# Altium footprint library Pcb-hionyPcbLib.PcbLib: 580 footprints (part 26 of 37)
Each footprint in its own frame and in the unit in brackets; x right, y up, seen from the top. Pads: shape width x height; smd on the part's side, far side on the other; paste and mask are expansions set on the pad; w line width, h text height; cw(c..) or ccw(c..) is an arc to the next point about the centre after c.
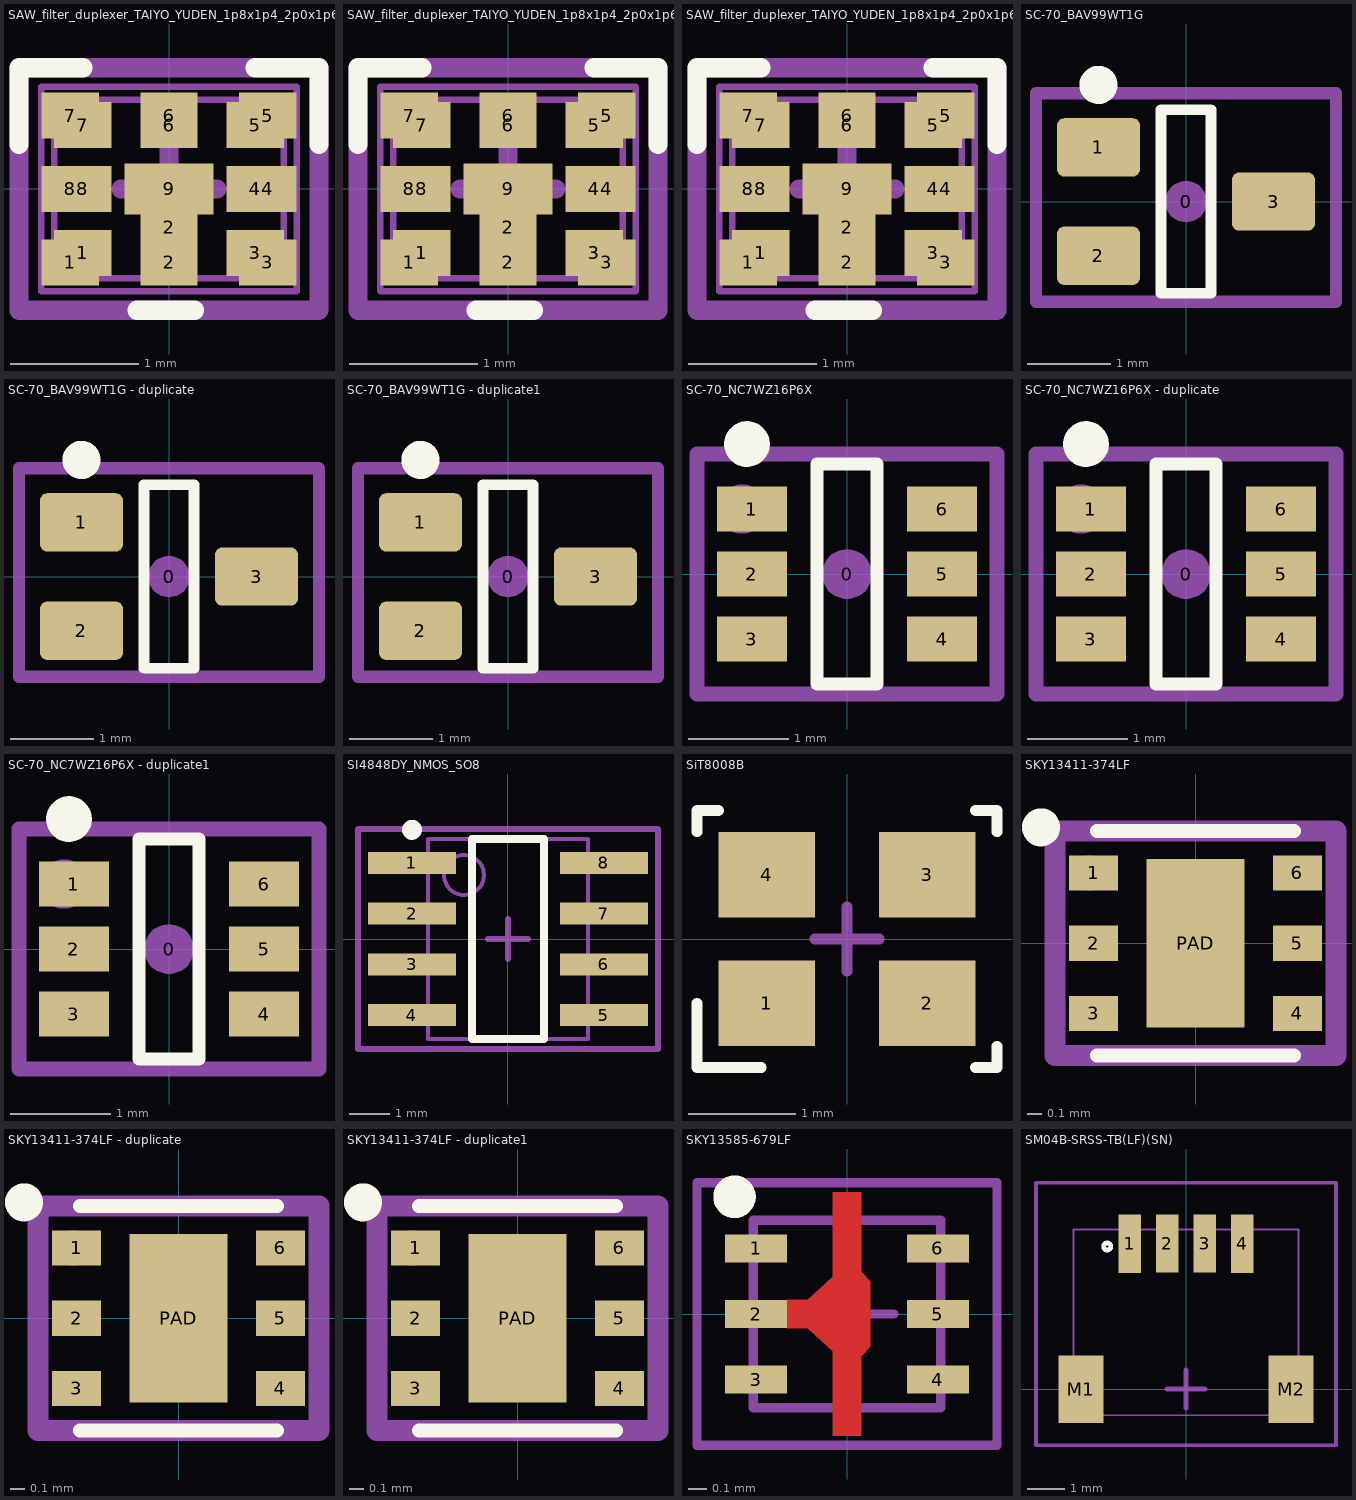
[diagram p25: the footprints below, top view; thin cyan lines are the x and y axes]

## SAW_filter_duplexer_TAIYO_YUDEN_1p8x1p4_2p0x1p6 [mm]
pads (17):
  rect 0.45x0.36 smd mask+0.05: 1(-0.775,-0.575) 1(-0.675,-0.5) 2(0,-0.575) 3(0.675,-0.5) 3(0.775,-0.575) 4(0.675,0) 4(0.775,0) 5(0.675,0.5) 5(0.775,0.575) 6(0,0.5) 6(0,0.575) 7(-0.775,0.575) 7(-0.675,0.5) 8(-0.775,0) 8(-0.675,0)
  rect 0.45x0.75 smd mask+0.05: 2(0,-0.3)
  rect 0.7x0.4 smd mask+0.05: 9(0,0)
Top Overlay:
  lines w0.15: -1.175,0.35 -1.175,0.95 -0.675,0.95 ; -0.25,-0.95 0.2,-0.95 ; 0.675,0.95 1.175,0.95 1.175,0.35
Top Solder:
  region: -1.05,-0.825 -1.05,0.825 1.05,0.825 1.05,-0.825
Mechanical 13:
  region: -0.15,-0.575 -0.15,-0.005 0.15,-0.005 0.15,-0.575
  region: 0.775,-0.575 0.775,-0.345 0.475,-0.345 0.475,-0.575
  region: 0.775,0.345 0.775,0.575 0.475,0.575 0.475,0.345
  region: 0.775,-0.115 0.775,0.115 0.475,0.115 0.475,-0.115
  region: -0.15,0.345 -0.15,0.575 0.15,0.575 0.15,0.345
  region: -0.775,-0.115 -0.775,0.115 -0.475,0.115 -0.475,-0.115
  region: -0.775,0.345 -0.775,0.575 -0.475,0.575 -0.475,0.345
  region: -0.775,-0.575 -0.775,-0.345 -0.475,-0.345 -0.475,-0.575
  region: 0.625,-0.15 0.625,0.15 0.925,0.15 0.925,-0.15
  region: -0.3,-0.15 -0.3,0.15 0.3,0.15 0.3,-0.15
  region: -0.925,0.725 -0.925,0.425 -0.625,0.425 -0.625,0.725
  region: -0.15,0.725 -0.15,0.425 0.15,0.425 0.15,0.725
  region: 0.625,0.725 0.625,0.425 0.925,0.425 0.925,0.725
  region: 0.625,-0.725 0.625,-0.425 0.925,-0.425 0.925,-0.725
  region: -0.925,-0.15 -0.925,0.15 -0.625,0.15 -0.625,-0.15
  region: -0.15,-0.725 -0.15,-0.425 0.15,-0.425 0.15,-0.725
  region: -0.925,-0.725 -0.925,-0.425 -0.625,-0.425 -0.625,-0.725
  lines w0.05: -1,-0.8 -1,0.8 1,0.8 1,-0.8 -1,-0.8 ; -0.9,-0.7 0.9,-0.7 0.9,0.7 -0.9,0.7 -0.9,-0.7
  text "7" at -0.425,0.37 h0.2
  text "5" at 0.3,0.375 h0.2
  text "3" at 0.3,-0.55 h0.2
  text "1" at -0.425,-0.55 h0.2
  text "1" at -0.55,-0.675 h0.2
  text "3" at 0.4,-0.675 h0.2
  text "5" at 0.4,0.475 h0.2
  text "7" at -0.55,0.475 h0.2
Mechanical 15:
  circle w0.2: c-0.8,-0.575 r0.035
  lines w0.15: -0.375,0 0,0 ; 0,-0.375 0,0 ; 0,0.375 0,0 ; 0.375,0 0,0 ; -1.175,-0.95 -1.175,0.95 1.175,0.95 1.175,-0.95 -1.175,-0.95
  text ".Designator" at 1.005,-0.703 h0.55
3D body: height 0.5, standoff 0, extent -0.9,-0.7 0.9,0.7
3D body: height 0.5, standoff 0, extent -1,-0.8 1,0.8
3D body: height 0.55, standoff 0.5, extent -0.898,-0.699 -0.5,-0.3

## SAW_filter_duplexer_TAIYO_YUDEN_1p8x1p4_2p0x1p6 - duplicate [mm]
pads (17):
  rect 0.45x0.36 smd mask+0.05: 1(-0.775,-0.575) 1(-0.675,-0.5) 2(0,-0.575) 3(0.675,-0.5) 3(0.775,-0.575) 4(0.675,0) 4(0.775,0) 5(0.675,0.5) 5(0.775,0.575) 6(0,0.5) 6(0,0.575) 7(-0.775,0.575) 7(-0.675,0.5) 8(-0.775,0) 8(-0.675,0)
  rect 0.45x0.75 smd mask+0.05: 2(0,-0.3)
  rect 0.7x0.4 smd mask+0.05: 9(0,0)
Top Overlay:
  lines w0.15: -1.175,0.35 -1.175,0.95 -0.675,0.95 ; -0.25,-0.95 0.2,-0.95 ; 0.675,0.95 1.175,0.95 1.175,0.35
Top Solder:
  region: -1.05,-0.825 -1.05,0.825 1.05,0.825 1.05,-0.825
Mechanical 13:
  region: -0.15,-0.575 -0.15,-0.005 0.15,-0.005 0.15,-0.575
  region: 0.775,-0.575 0.775,-0.345 0.475,-0.345 0.475,-0.575
  region: 0.775,0.345 0.775,0.575 0.475,0.575 0.475,0.345
  region: 0.775,-0.115 0.775,0.115 0.475,0.115 0.475,-0.115
  region: -0.15,0.345 -0.15,0.575 0.15,0.575 0.15,0.345
  region: -0.775,-0.115 -0.775,0.115 -0.475,0.115 -0.475,-0.115
  region: -0.775,0.345 -0.775,0.575 -0.475,0.575 -0.475,0.345
  region: -0.775,-0.575 -0.775,-0.345 -0.475,-0.345 -0.475,-0.575
  region: 0.625,-0.15 0.625,0.15 0.925,0.15 0.925,-0.15
  region: -0.3,-0.15 -0.3,0.15 0.3,0.15 0.3,-0.15
  region: -0.925,0.725 -0.925,0.425 -0.625,0.425 -0.625,0.725
  region: -0.15,0.725 -0.15,0.425 0.15,0.425 0.15,0.725
  region: 0.625,0.725 0.625,0.425 0.925,0.425 0.925,0.725
  region: 0.625,-0.725 0.625,-0.425 0.925,-0.425 0.925,-0.725
  region: -0.925,-0.15 -0.925,0.15 -0.625,0.15 -0.625,-0.15
  region: -0.15,-0.725 -0.15,-0.425 0.15,-0.425 0.15,-0.725
  region: -0.925,-0.725 -0.925,-0.425 -0.625,-0.425 -0.625,-0.725
  lines w0.05: -1,-0.8 -1,0.8 1,0.8 1,-0.8 -1,-0.8 ; -0.9,-0.7 0.9,-0.7 0.9,0.7 -0.9,0.7 -0.9,-0.7
  text "7" at -0.425,0.37 h0.2
  text "5" at 0.3,0.375 h0.2
  text "3" at 0.3,-0.55 h0.2
  text "1" at -0.425,-0.55 h0.2
  text "1" at -0.55,-0.675 h0.2
  text "3" at 0.4,-0.675 h0.2
  text "5" at 0.4,0.475 h0.2
  text "7" at -0.55,0.475 h0.2
Mechanical 15:
  circle w0.2: c-0.8,-0.575 r0.035
  lines w0.15: -0.375,0 0,0 ; 0,-0.375 0,0 ; 0,0.375 0,0 ; 0.375,0 0,0 ; -1.175,-0.95 -1.175,0.95 1.175,0.95 1.175,-0.95 -1.175,-0.95
  text ".Designator" at -1.55,-0.675 h0.55
3D body: height 0.5, standoff 0, extent -0.9,-0.7 0.9,0.7
3D body: height 0.5, standoff 0, extent -1,-0.8 1,0.8
3D body: height 0.55, standoff 0.5, extent -0.898,-0.699 -0.5,-0.3

## SAW_filter_duplexer_TAIYO_YUDEN_1p8x1p4_2p0x1p6 - duplicate1 [mm]
pads (17):
  rect 0.45x0.36 smd mask+0.05: 1(-0.775,-0.575) 1(-0.675,-0.5) 2(0,-0.575) 3(0.675,-0.5) 3(0.775,-0.575) 4(0.675,0) 4(0.775,0) 5(0.675,0.5) 5(0.775,0.575) 6(0,0.5) 6(0,0.575) 7(-0.775,0.575) 7(-0.675,0.5) 8(-0.775,0) 8(-0.675,0)
  rect 0.45x0.75 smd mask+0.05: 2(0,-0.3)
  rect 0.7x0.4 smd mask+0.05: 9(0,0)
Top Overlay:
  lines w0.15: -1.175,0.35 -1.175,0.95 -0.675,0.95 ; -0.25,-0.95 0.2,-0.95 ; 0.675,0.95 1.175,0.95 1.175,0.35
Top Solder:
  region: -1.05,-0.825 -1.05,0.825 1.05,0.825 1.05,-0.825
Mechanical 13:
  region: -0.15,-0.575 -0.15,-0.005 0.15,-0.005 0.15,-0.575
  region: 0.775,-0.575 0.775,-0.345 0.475,-0.345 0.475,-0.575
  region: 0.775,0.345 0.775,0.575 0.475,0.575 0.475,0.345
  region: 0.775,-0.115 0.775,0.115 0.475,0.115 0.475,-0.115
  region: -0.15,0.345 -0.15,0.575 0.15,0.575 0.15,0.345
  region: -0.775,-0.115 -0.775,0.115 -0.475,0.115 -0.475,-0.115
  region: -0.775,0.345 -0.775,0.575 -0.475,0.575 -0.475,0.345
  region: -0.775,-0.575 -0.775,-0.345 -0.475,-0.345 -0.475,-0.575
  region: 0.625,-0.15 0.625,0.15 0.925,0.15 0.925,-0.15
  region: -0.3,-0.15 -0.3,0.15 0.3,0.15 0.3,-0.15
  region: -0.925,0.725 -0.925,0.425 -0.625,0.425 -0.625,0.725
  region: -0.15,0.725 -0.15,0.425 0.15,0.425 0.15,0.725
  region: 0.625,0.725 0.625,0.425 0.925,0.425 0.925,0.725
  region: 0.625,-0.725 0.625,-0.425 0.925,-0.425 0.925,-0.725
  region: -0.925,-0.15 -0.925,0.15 -0.625,0.15 -0.625,-0.15
  region: -0.15,-0.725 -0.15,-0.425 0.15,-0.425 0.15,-0.725
  region: -0.925,-0.725 -0.925,-0.425 -0.625,-0.425 -0.625,-0.725
  lines w0.05: -1,-0.8 -1,0.8 1,0.8 1,-0.8 -1,-0.8 ; -0.9,-0.7 0.9,-0.7 0.9,0.7 -0.9,0.7 -0.9,-0.7
  text "7" at -0.425,0.37 h0.2
  text "5" at 0.3,0.375 h0.2
  text "3" at 0.3,-0.55 h0.2
  text "1" at -0.425,-0.55 h0.2
  text "1" at -0.55,-0.675 h0.2
  text "3" at 0.4,-0.675 h0.2
  text "5" at 0.4,0.475 h0.2
  text "7" at -0.55,0.475 h0.2
Mechanical 15:
  circle w0.2: c-0.8,-0.575 r0.035
  lines w0.15: -0.375,0 0,0 ; 0,-0.375 0,0 ; 0,0.375 0,0 ; 0.375,0 0,0 ; -1.175,-0.95 -1.175,0.95 1.175,0.95 1.175,-0.95 -1.175,-0.95
  text ".Designator" at -1.55,-0.675 h0.55
3D body: height 0.5, standoff 0, extent -0.9,-0.7 0.9,0.7
3D body: height 0.5, standoff 0, extent -1,-0.8 1,0.8
3D body: height 0.55, standoff 0.5, extent -0.898,-0.699 -0.5,-0.3

## SC-70_BAV99WT1G [mm]
pads (4):
  round 0.5 on Mech15: 0(0,0)
  rrect25% 1x0.7 smd: 1(-1.05,0.65) 2(-1.05,-0.65) 3(1.05,0)
Top Overlay:
  circle w0.254: c-1.05,1.4 r0.102
  lines w0.127: -0.3,-1.1 0.3,-1.1 0.3,1.1 -0.3,1.1 -0.3,-1.1
Mechanical 15:
  circle w0.35: c-1.05,0.65 r0.127
  lines w0.15: -1.8,-1.2 1.8,-1.2 1.8,1.3 -1.8,1.3 -1.8,-1.2
  text ".Designator" at 0.5,0.9 h0.55
3D body "User Library-sc70-3.step": height 0.99, standoff -0.01, extent -1.15,-1.05 1.15,1.05

## SC-70_BAV99WT1G - duplicate [mm]
pads (4):
  round 0.5 on Mech15: 0(0,0)
  rrect25% 1x0.7 smd: 1(-1.05,0.65) 2(-1.05,-0.65) 3(1.05,0)
Top Overlay:
  circle w0.254: c-1.05,1.4 r0.102
  lines w0.127: -0.3,-1.1 0.3,-1.1 0.3,1.1 -0.3,1.1 -0.3,-1.1
Mechanical 15:
  circle w0.35: c-1.05,0.65 r0.127
  lines w0.15: -1.8,-1.2 1.8,-1.2 1.8,1.3 -1.8,1.3 -1.8,-1.2
  text ".Designator" at 0.5,0.9 h0.55
3D body "User Library-sc70-3.step": height 0.99, standoff -0.01, extent -1.15,-1.05 1.15,1.05

## SC-70_BAV99WT1G - duplicate1 [mm]
pads (4):
  round 0.5 on Mech15: 0(0,0)
  rrect25% 1x0.7 smd: 1(-1.05,0.65) 2(-1.05,-0.65) 3(1.05,0)
Top Overlay:
  circle w0.254: c-1.05,1.4 r0.102
  lines w0.127: -0.3,-1.1 -0.3,1.1 0.3,1.1 0.3,-1.1 -0.3,-1.1
Mechanical 15:
  circle w0.35: c-1.05,0.65 r0.127
  lines w0.15: -1.8,-1.2 -1.8,1.3 1.8,1.3 1.8,-1.2 -1.8,-1.2
  text ".Designator" at 0.5,0.9 h0.55
3D body "User Library-sc70-3.step": height 0.99, standoff -0.01, extent -1.15,-1.05 1.15,1.05

## SC-70_NC7WZ16P6X [mm]
pads (7):
  round 0.5 on Mech15: 0(0,0)
  rect 0.7x0.45 smd: 1(-0.95,0.65) 2(-0.95,0) 3(-0.95,-0.65) 4(0.95,-0.65) 5(0.95,0) 6(0.95,0.65)
Top Overlay:
  circle w0.254: c-1,1.3 r0.102
  lines w0.127: -0.3,-1.1 -0.3,1.1 0.3,1.1 0.3,-1.1 -0.3,-1.1
Mechanical 15:
  circle w0.35: c-1.05,0.65 r0.071
  lines w0.15: -1.5,-1.2 -1.5,1.2 1.5,1.2 1.5,-1.2 -1.5,-1.2
  text ".Designator" at 0.922,-1.525 h0.55
3D body "User Library-SC70-6.step": height 0.92, standoff -0.03, extent -1.05,-1 1.05,1

## SC-70_NC7WZ16P6X - duplicate [mm]
pads (7):
  round 0.5 on Mech15: 0(0,0)
  rect 0.7x0.45 smd: 1(-0.95,0.65) 2(-0.95,0) 3(-0.95,-0.65) 4(0.95,-0.65) 5(0.95,0) 6(0.95,0.65)
Top Overlay:
  circle w0.254: c-1,1.3 r0.102
  lines w0.127: -0.3,-1.1 -0.3,1.1 0.3,1.1 0.3,-1.1 -0.3,-1.1
Mechanical 15:
  circle w0.35: c-1.05,0.65 r0.071
  lines w0.15: -1.5,-1.2 -1.5,1.2 1.5,1.2 1.5,-1.2 -1.5,-1.2
  text ".Designator" at 0.922,-1.525 h0.55
3D body "User Library-SC70-6.step": height 0.92, standoff -0.03, extent -1.05,-1 1.05,1

## SC-70_NC7WZ16P6X - duplicate1 [mm]
pads (7):
  round 0.5 on Mech15: 0(0,0)
  rect 0.7x0.45 smd: 1(-0.95,0.65) 2(-0.95,0) 3(-0.95,-0.65) 4(0.95,-0.65) 5(0.95,0) 6(0.95,0.65)
Top Overlay:
  circle w0.254: c-1,1.3 r0.102
  lines w0.127: -0.3,-1.1 -0.3,1.1 0.3,1.1 0.3,-1.1 -0.3,-1.1
Mechanical 15:
  circle w0.35: c-1.05,0.65 r0.071
  lines w0.15: -1.5,-1.2 -1.5,1.2 1.5,1.2 1.5,-1.2 -1.5,-1.2
  text ".Designator" at 0.922,-1.525 h0.55
3D body "User Library-SC70-6.step": height 0.92, standoff -0.03, extent -1.05,-1 1.05,1

## SI4848DY_NMOS_SO8 [mm]
pads (8):
  rect 2.2x0.55 smd: 1(-2.4,1.905) 2(-2.4,0.635) 3(-2.4,-0.635) 4(-2.4,-1.905) 5(2.4,-1.905) 6(2.4,-0.635) 7(2.4,0.635) 8(2.4,1.905)
Top Overlay:
  circle w0.25: c-2.4,2.73 r0.125
  lines w0.2: -0.9,-2.5 0.9,-2.5 0.9,2.5 -0.9,2.5 -0.9,-2.5
Mechanical 13:
  circle w0.1: c-1.1,1.6 r0.5
  lines w0.1: -2,-2.5 2,-2.5 2,2.5 -2,2.5 -2,-2.5
Mechanical 15:
  lines w0.15: -0.5,0 0.5,0 ; 0,-0.5 0,0.5 ; -3.75,-2.75 3.75,-2.75 3.75,2.75 -3.75,2.75 -3.75,-2.75
  text ".Designator" at 0.85,0.75 h0.55
3D body "CircuitWorks-SO-8.step": height 1.45, standoff 0, extent -2.889,-2.45 2.889,2.452

## SiT8008B [mm]
pads (4):
  rect 0.9x0.8 smd: 1(-0.75,-0.6) 2(0.75,-0.6) 3(0.75,0.6) 4(-0.75,0.6)
Top Overlay:
  lines w0.1: -1.4,-0.6 -1.4,-1.2 -0.8,-1.2 ; -1.4,1 -1.4,1.2 -1.2,1.2 ; 1.2,-1.2 1.4,-1.2 1.4,-1 ; 1.2,1.2 1.4,1.2 1.4,1
Mechanical 15:
  lines w0.1: -0.3,0 0.3,0 ; 0,-0.3 0,0.3
3D body "Crystal IQXC-42.stp": height 0.51, standoff 0.01, extent -1,-0.8 1,0.8

## SKY13411-374LF [mm]
pads (7):
  rect 0.35x0.25 smd mask+0.05: 1(-0.725,0.5) 2(-0.725,0) 3(-0.725,-0.5) 4(0.725,-0.5) 5(0.725,0) 6(0.725,0.5)
  rect 0.7x1.2 smd mask+0.05: PAD(0,0)
Top Overlay:
  circle w0.2: c-1.1,0.825 r0.035
  lines w0.1: -0.7,-0.8 0.7,-0.8 ; -0.7,0.8 0.7,0.8
Mechanical 15:
  circle w0.2: c-0.75,0.5 r0.025
  lines w0.15: -0.2,0 0.2,0 ; 0,-0.2 0,0.2 ; -1,-0.8 1,-0.8 1,0.8 -1,0.8 -1,-0.8
  text ".Designator" at 0.223,0.675 h0.55
3D body "User Library-DFN 6 2x2_v2.STEP": height 0.48, standoff -0.03, extent -0.752,-0.75 0.751,0.75

## SKY13411-374LF - duplicate [mm]
pads (7):
  rect 0.35x0.25 smd mask+0.05: 1(-0.725,0.5) 2(-0.725,0) 3(-0.725,-0.5) 4(0.725,-0.5) 5(0.725,0) 6(0.725,0.5)
  rect 0.7x1.2 smd mask+0.05: PAD(0,0)
Top Overlay:
  circle w0.2: c-1.1,0.825 r0.035
  lines w0.1: -0.7,-0.8 0.7,-0.8 ; -0.7,0.8 0.7,0.8
Mechanical 15:
  circle w0.2: c-0.75,0.5 r0.025
  lines w0.15: -0.2,0 0.2,0 ; 0,-0.2 0,0.2 ; -1,-0.8 1,-0.8 1,0.8 -1,0.8 -1,-0.8
  text ".Designator" at -2.925,-0.225 h0.55
3D body "User Library-DFN 6 2x2_v2.STEP": height 0.48, standoff -0.03, extent -0.752,-0.75 0.751,0.75

## SKY13411-374LF - duplicate1 [mm]
pads (7):
  rect 0.35x0.25 smd mask+0.05: 1(-0.725,0.5) 2(-0.725,0) 3(-0.725,-0.5) 4(0.725,-0.5) 5(0.725,0) 6(0.725,0.5)
  rect 0.7x1.2 smd mask+0.05: PAD(0,0)
Top Overlay:
  circle w0.2: c-1.1,0.825 r0.035
  lines w0.1: -0.7,-0.8 0.7,-0.8 ; -0.7,0.8 0.7,0.8
Mechanical 15:
  circle w0.2: c-0.75,0.5 r0.025
  lines w0.15: -0.2,0 0.2,0 ; 0,-0.2 0,0.2 ; -1,-0.8 1,-0.8 1,0.8 -1,0.8 -1,-0.8
  text ".Designator" at -2.925,-0.225 h0.55
3D body "User Library-DFN 6 2x2_v2.STEP": height 0.48, standoff -0.03, extent -0.752,-0.75 0.751,0.75

## SKY13585-679LF [mm]
pads (6):
  rect 0.33x0.15 smd mask+0.05: 1(-0.485,0.35) 2(-0.485,0) 3(-0.485,-0.35) 4(0.485,-0.35) 5(0.485,0) 6(0.485,0.35)
Top Layer:
  region: -0.075,0.65 0.075,0.65 0.075,-0.65 -0.075,-0.65
  region: -0.21,-0.075 -0.075,-0.198 -0.075,0.198 -0.21,0.075 -0.321,0.075 -0.321,-0.075
  region: 0.075,0.225 0.125,0.175 0.125,-0.175 0.075,-0.225
Top Overlay:
  circle w0.127: c-0.6,0.625 r0.05
Top Paste:
  region: -0.075,0.65 0.075,0.65 0.075,-0.65 -0.075,-0.65
  region: -0.21,-0.075 -0.075,-0.198 -0.075,0.198 -0.21,0.075 -0.321,0.075 -0.321,-0.075
  region: 0.075,0.225 0.125,0.175 0.125,-0.175 0.075,-0.225
Top Solder:
  region: -0.275,-0.125 -0.225,-0.125 -0.125,-0.225 -0.125,-0.7 0.125,-0.7 0.125,-0.225 0.175,-0.175 0.175,0.2 0.125,0.25 0.125,0.7 -0.125,0.7 -0.125,0.225 -0.225,0.125 -0.275,0.125
Mechanical 11:
  text ".Designator" at -0.6,-0.3 h0.5
Mechanical 13:
  circle w0.05: c-0.4,0.35 r0.025
  lines w0.05: -0.5,-0.5 0.5,-0.5 0.5,0.5 -0.5,0.5 -0.5,-0.5
Mechanical 15:
  lines w0.05: -0.25,0 0.25,0 ; 0,-0.25 0,0.25 ; 0,-0.1 0,0.1 ; -0.8,-0.7 0.8,-0.7 0.8,0.7 -0.8,0.7 -0.8,-0.7
3D body: height 0.36, standoff 0.35, extent -0.5,0.3 -0.3,0.5
3D body: height 0.35, standoff 0.01, extent -0.5,-0.5 0.5,0.5

## SM04B-SRSS-TB(LF)(SN) [mm]
pads (6):
  rect 0.6x1.55 smd: 1(-1.5,3.875) 2(-0.5,3.875) 3(0.5,3.875) 4(1.5,3.875)
  rect 1.2x1.8 smd: M1(-2.8,0) M2(2.8,0)
Top Overlay:
  circle w0.127: c-2.1,3.8 r0.096
Mechanical 11:
  text ".Designator" at 0.225,1.025 h0.5
Mechanical 13:
  lines w0.05: -3,-0.7 3,-0.7 3,4.255 -3,4.255 -3,-0.7
Mechanical 15:
  lines w0.1: -4,-1.5 4,-1.5 4,5.5 -4,5.5 -4,-1.5
  lines w0.127: -0.508,0 0.508,0 ; 0,-0.508 0,0.508
3D body "SM04B-SRSS-TB.STEP": height 2.96, standoff 0, extent -3,-0.695 3,4.255